# Altium footprint library Connector_PinHeader_1.27mm.PcbLib: 278 footprints (part 15 of 18) (continued)
## PinHeader_2x24_P1.27mm_Vertical_SMD [mm] (continued)
  text "'.Designator'" at 0.84,-4.047 h1

## PinHeader_2x25_P1.27mm_Horizontal [mm]
pads (50):
  rect 1x1 hole 0.65: 1(0,0)
  rrect100% 1x1 hole 0.65: 2(1.27,0) 3(0,-1.27) 4(1.27,-1.27) 5(0,-2.54) 6(1.27,-2.54) 7(0,-3.81) 8(1.27,-3.81) 9(0,-5.08) 10(1.27,-5.08) 11(0,-6.35) 12(1.27,-6.35) 13(0,-7.62) 14(1.27,-7.62) 15(0,-8.89) 16(1.27,-8.89) 17(0,-10.16) 18(1.27,-10.16) 19(0,-11.43) 20(1.27,-11.43) 21(0,-12.7) 22(1.27,-12.7) 23(0,-13.97) 24(1.27,-13.97) 25(0,-15.24) 26(1.27,-15.24) 27(0,-16.51) 28(1.27,-16.51) 29(0,-17.78) 30(1.27,-17.78) 31(0,-19.05) 32(1.27,-19.05) 33(0,-20.32) 34(1.27,-20.32) 35(0,-21.59) 36(1.27,-21.59) 37(0,-22.86) 38(1.27,-22.86) 39(0,-24.13) 40(1.27,-24.13) 41(0,-25.4) 42(1.27,-25.4) 43(0,-26.67) 44(1.27,-26.67) 45(0,-27.94) 46(1.27,-27.94) 47(0,-29.21) 48(1.27,-29.21) 49(0,-30.48) 50(1.27,-30.48)
F.SilkS:
  lines w0.12: -0.76,0 -0.76,0.76 0,0.76 ; 1.71,-31.1 1.71,-31.175 2.83,-31.175 2.83,0.695 1.71,0.695 1.71,0.62 ; 1.71,-29.86 1.71,-29.83 ; 1.71,-29.845 2.83,-29.845 ; 1.71,-28.59 1.71,-28.56 ; 1.71,-28.575 2.83,-28.575 ; 1.71,-27.32 1.71,-27.29 ; 1.71,-27.305 2.83,-27.305 ; 1.71,-26.05 1.71,-26.02 ; 1.71,-26.035 2.83,-26.035 ; 1.71,-24.78 1.71,-24.75 ; 1.71,-24.765 2.83,-24.765 ; 1.71,-23.51 1.71,-23.48 ; 1.71,-23.495 2.83,-23.495 ; 1.71,-22.24 1.71,-22.21 ; 1.71,-22.225 2.83,-22.225 ; 1.71,-20.97 1.71,-20.94 ; 1.71,-20.955 2.83,-20.955 ; 1.71,-19.7 1.71,-19.67 ; 1.71,-19.685 2.83,-19.685 ; 1.71,-18.43 1.71,-18.4 ; 1.71,-18.415 2.83,-18.415 ; 1.71,-17.16 1.71,-17.13 ; 1.71,-17.145 2.83,-17.145 ; 1.71,-15.89 1.71,-15.86 ; 1.71,-15.875 2.83,-15.875 ; 1.71,-14.62 1.71,-14.59 ; 1.71,-14.605 2.83,-14.605 ; 1.71,-13.35 1.71,-13.32 ; 1.71,-13.335 2.83,-13.335 ; 1.71,-12.08 1.71,-12.05 ; 1.71,-12.065 2.83,-12.065 ; 1.71,-10.81 1.71,-10.78 ; 1.71,-10.795 2.83,-10.795 ; 1.71,-9.54 1.71,-9.51 ; 1.71,-9.525 2.83,-9.525 ; 1.71,-8.27 1.71,-8.24 ; 1.71,-8.255 2.83,-8.255 ; 1.71,-7 1.71,-6.97 ; 1.71,-6.985 2.83,-6.985 ; 1.71,-5.73 1.71,-5.7 ; 1.71,-5.715 2.83,-5.715 ; 1.71,-4.46 1.71,-4.43 ; 1.71,-4.445 2.83,-4.445 ; 1.71,-3.19 1.71,-3.16 ; 1.71,-3.175 2.83,-3.175 ; 1.71,-1.92 1.71,-1.89 ; 1.71,-1.905 2.83,-1.905 ; 1.71,-0.65 1.71,-0.62 ; 1.71,-0.635 2.83,-0.635 ; 2.83,-30.74 6.83,-30.74 6.83,-30.22 2.83,-30.22 ; 2.83,-29.47 6.83,-29.47 6.83,-28.95 2.83,-28.95 ; 2.83,-28.2 6.83,-28.2 6.83,-27.68 2.83,-27.68 ; 2.83,-26.93 6.83,-26.93 6.83,-26.41 2.83,-26.41 ; 2.83,-25.66 6.83,-25.66 6.83,-25.14 2.83,-25.14 ; 2.83,-24.39 6.83,-24.39 6.83,-23.87 2.83,-23.87 ; 2.83,-23.12 6.83,-23.12 6.83,-22.6 2.83,-22.6 ; 2.83,-21.85 6.83,-21.85 6.83,-21.33 2.83,-21.33 ; 2.83,-20.58 6.83,-20.58 6.83,-20.06 2.83,-20.06 ; 2.83,-19.31 6.83,-19.31 6.83,-18.79 2.83,-18.79 ; 2.83,-18.04 6.83,-18.04 6.83,-17.52 2.83,-17.52 ; 2.83,-16.77 6.83,-16.77 6.83,-16.25 2.83,-16.25 ; 2.83,-15.5 6.83,-15.5 6.83,-14.98 2.83,-14.98 ; 2.83,-14.23 6.83,-14.23 6.83,-13.71 2.83,-13.71 ; 2.83,-12.96 6.83,-12.96 6.83,-12.44 2.83,-12.44 ; 2.83,-11.69 6.83,-11.69 6.83,-11.17 2.83,-11.17 ; 2.83,-10.42 6.83,-10.42 6.83,-9.9 2.83,-9.9 ; 2.83,-9.15 6.83,-9.15 6.83,-8.63 2.83,-8.63 ; 2.83,-7.88 6.83,-7.88 6.83,-7.36 2.83,-7.36 ; 2.83,-6.61 6.83,-6.61 6.83,-6.09 2.83,-6.09 ; 2.83,-5.34 6.83,-5.34 6.83,-4.82 2.83,-4.82 ; 2.83,-4.07 6.83,-4.07 6.83,-3.55 2.83,-3.55 ; 2.83,-2.8 6.83,-2.8 6.83,-2.28 2.83,-2.28 ; 2.83,-1.53 6.83,-1.53 6.83,-1.01 2.83,-1.01 ; 2.83,-0.26 6.83,-0.26 6.83,0.26 2.83,0.26 ; 2.83,-0.16 6.83,-0.16 ; 2.83,-0.04 6.83,-0.04 ; 2.83,0.08 6.83,0.08 ; 2.83,0.2 6.83,0.2
F.CrtYd:
  lines w0.05: -1.15,-31.65 -1.15,1.15 7.3,1.15 7.3,-31.65 -1.15,-31.65
F.Fab:
  drawing of 155 lines, arcs and shapes, not listed
  text "'.Designator'" at 2.774,-17.668 h0.6

## PinHeader_2x25_P1.27mm_Vertical [mm]
pads (50):
  rect 1x1 hole 0.65: 1(0,0)
  rrect100% 1x1 hole 0.65: 2(1.27,0) 3(0,-1.27) 4(1.27,-1.27) 5(0,-2.54) 6(1.27,-2.54) 7(0,-3.81) 8(1.27,-3.81) 9(0,-5.08) 10(1.27,-5.08) 11(0,-6.35) 12(1.27,-6.35) 13(0,-7.62) 14(1.27,-7.62) 15(0,-8.89) 16(1.27,-8.89) 17(0,-10.16) 18(1.27,-10.16) 19(0,-11.43) 20(1.27,-11.43) 21(0,-12.7) 22(1.27,-12.7) 23(0,-13.97) 24(1.27,-13.97) 25(0,-15.24) 26(1.27,-15.24) 27(0,-16.51) 28(1.27,-16.51) 29(0,-17.78) 30(1.27,-17.78) 31(0,-19.05) 32(1.27,-19.05) 33(0,-20.32) 34(1.27,-20.32) 35(0,-21.59) 36(1.27,-21.59) 37(0,-22.86) 38(1.27,-22.86) 39(0,-24.13) 40(1.27,-24.13) 41(0,-25.4) 42(1.27,-25.4) 43(0,-26.67) 44(1.27,-26.67) 45(0,-27.94) 46(1.27,-27.94) 47(0,-29.21) 48(1.27,-29.21) 49(0,-30.48) 50(1.27,-30.48)
F.SilkS:
  lines w0.12: -1.13,0 -1.13,0.76 0,0.76 ; -0.563,-0.76 -1.13,-0.76 -1.13,-31.175 -0.308,-31.175 ; 0.308,-31.175 0.962,-31.175 ; 0.563,-0.76 0.707,-0.76 ; 0.76,-0.707 0.76,-0.563 ; 0.76,0.563 0.76,0.695 0.962,0.695 ; 1.578,-31.175 2.4,-31.175 2.4,0.695 1.578,0.695
F.CrtYd:
  lines w0.05: -1.6,-31.65 -1.6,1.15 2.85,1.15 2.85,-31.65 -1.6,-31.65
F.Fab:
  lines w0.1: -1.07,-31.115 2.34,-31.115 2.34,0.635 -0.218,0.635 -1.07,-0.218 -1.07,-31.115
  text "'.Designator'" at 1.475,-19.287 h1

## PinHeader_2x25_P1.27mm_Vertical_SMD [mm]
pads (50):
  rect 2.4x0.74 smd: 1(-1.95,15.24) 2(1.95,15.24) 3(-1.95,13.97) 4(1.95,13.97) 5(-1.95,12.7) 6(1.95,12.7) 7(-1.95,11.43) 8(1.95,11.43) 9(-1.95,10.16) 10(1.95,10.16) 11(-1.95,8.89) 12(1.95,8.89) 13(-1.95,7.62) 14(1.95,7.62) 15(-1.95,6.35) 16(1.95,6.35) 17(-1.95,5.08) 18(1.95,5.08) 19(-1.95,3.81) 20(1.95,3.81) 21(-1.95,2.54) 22(1.95,2.54) 23(-1.95,1.27) 24(1.95,1.27) 25(-1.95,0) 26(1.95,0) 27(-1.95,-1.27) 28(1.95,-1.27) 29(-1.95,-2.54) 30(1.95,-2.54) 31(-1.95,-3.81) 32(1.95,-3.81) 33(-1.95,-5.08) 34(1.95,-5.08) 35(-1.95,-6.35) 36(1.95,-6.35) 37(-1.95,-7.62) 38(1.95,-7.62) 39(-1.95,-8.89) 40(1.95,-8.89) 41(-1.95,-10.16) 42(1.95,-10.16) 43(-1.95,-11.43) 44(1.95,-11.43) 45(-1.95,-12.7) 46(1.95,-12.7) 47(-1.95,-13.97) 48(1.95,-13.97) 49(-1.95,-15.24) 50(1.95,-15.24)
F.SilkS:
  lines w0.12: -3.09,15.87 -1.765,15.87 -1.765,15.935 1.765,15.935 1.765,15.87 ; -1.765,-15.87 -1.765,-15.935 1.765,-15.935 1.765,-15.87
F.CrtYd:
  lines w0.05: -4.3,-16.4 4.3,-16.4 4.3,16.4 -4.3,16.4 -4.3,-16.4
F.Fab:
  drawing of 155 lines, arcs and shapes, not listed
  text "'.Designator'" at 0.84,-4.047 h1

## PinHeader_2x26_P1.27mm_Horizontal [mm]
pads (52):
  rect 1x1 hole 0.65: 1(0,0)
  rrect100% 1x1 hole 0.65: 2(1.27,0) 3(0,-1.27) 4(1.27,-1.27) 5(0,-2.54) 6(1.27,-2.54) 7(0,-3.81) 8(1.27,-3.81) 9(0,-5.08) 10(1.27,-5.08) 11(0,-6.35) 12(1.27,-6.35) 13(0,-7.62) 14(1.27,-7.62) 15(0,-8.89) 16(1.27,-8.89) 17(0,-10.16) 18(1.27,-10.16) 19(0,-11.43) 20(1.27,-11.43) 21(0,-12.7) 22(1.27,-12.7) 23(0,-13.97) 24(1.27,-13.97) 25(0,-15.24) 26(1.27,-15.24) 27(0,-16.51) 28(1.27,-16.51) 29(0,-17.78) 30(1.27,-17.78) 31(0,-19.05) 32(1.27,-19.05) 33(0,-20.32) 34(1.27,-20.32) 35(0,-21.59) 36(1.27,-21.59) 37(0,-22.86) 38(1.27,-22.86) 39(0,-24.13) 40(1.27,-24.13) 41(0,-25.4) 42(1.27,-25.4) 43(0,-26.67) 44(1.27,-26.67) 45(0,-27.94) 46(1.27,-27.94) 47(0,-29.21) 48(1.27,-29.21) 49(0,-30.48) 50(1.27,-30.48) 51(0,-31.75) 52(1.27,-31.75)
F.SilkS:
  lines w0.12: -0.76,0 -0.76,0.76 0,0.76 ; 1.71,-32.37 1.71,-32.445 2.83,-32.445 2.83,0.695 1.71,0.695 1.71,0.62 ; 1.71,-31.13 1.71,-31.1 ; 1.71,-31.115 2.83,-31.115 ; 1.71,-29.86 1.71,-29.83 ; 1.71,-29.845 2.83,-29.845 ; 1.71,-28.59 1.71,-28.56 ; 1.71,-28.575 2.83,-28.575 ; 1.71,-27.32 1.71,-27.29 ; 1.71,-27.305 2.83,-27.305 ; 1.71,-26.05 1.71,-26.02 ; 1.71,-26.035 2.83,-26.035 ; 1.71,-24.78 1.71,-24.75 ; 1.71,-24.765 2.83,-24.765 ; 1.71,-23.51 1.71,-23.48 ; 1.71,-23.495 2.83,-23.495 ; 1.71,-22.24 1.71,-22.21 ; 1.71,-22.225 2.83,-22.225 ; 1.71,-20.97 1.71,-20.94 ; 1.71,-20.955 2.83,-20.955 ; 1.71,-19.7 1.71,-19.67 ; 1.71,-19.685 2.83,-19.685 ; 1.71,-18.43 1.71,-18.4 ; 1.71,-18.415 2.83,-18.415 ; 1.71,-17.16 1.71,-17.13 ; 1.71,-17.145 2.83,-17.145 ; 1.71,-15.89 1.71,-15.86 ; 1.71,-15.875 2.83,-15.875 ; 1.71,-14.62 1.71,-14.59 ; 1.71,-14.605 2.83,-14.605 ; 1.71,-13.35 1.71,-13.32 ; 1.71,-13.335 2.83,-13.335 ; 1.71,-12.08 1.71,-12.05 ; 1.71,-12.065 2.83,-12.065 ; 1.71,-10.81 1.71,-10.78 ; 1.71,-10.795 2.83,-10.795 ; 1.71,-9.54 1.71,-9.51 ; 1.71,-9.525 2.83,-9.525 ; 1.71,-8.27 1.71,-8.24 ; 1.71,-8.255 2.83,-8.255 ; 1.71,-7 1.71,-6.97 ; 1.71,-6.985 2.83,-6.985 ; 1.71,-5.73 1.71,-5.7 ; 1.71,-5.715 2.83,-5.715 ; 1.71,-4.46 1.71,-4.43 ; 1.71,-4.445 2.83,-4.445 ; 1.71,-3.19 1.71,-3.16 ; 1.71,-3.175 2.83,-3.175 ; 1.71,-1.92 1.71,-1.89 ; 1.71,-1.905 2.83,-1.905 ; 1.71,-0.65 1.71,-0.62 ; 1.71,-0.635 2.83,-0.635 ; 2.83,-32.01 6.83,-32.01 6.83,-31.49 2.83,-31.49 ; 2.83,-30.74 6.83,-30.74 6.83,-30.22 2.83,-30.22 ; 2.83,-29.47 6.83,-29.47 6.83,-28.95 2.83,-28.95 ; 2.83,-28.2 6.83,-28.2 6.83,-27.68 2.83,-27.68 ; 2.83,-26.93 6.83,-26.93 6.83,-26.41 2.83,-26.41 ; 2.83,-25.66 6.83,-25.66 6.83,-25.14 2.83,-25.14 ; 2.83,-24.39 6.83,-24.39 6.83,-23.87 2.83,-23.87 ; 2.83,-23.12 6.83,-23.12 6.83,-22.6 2.83,-22.6 ; 2.83,-21.85 6.83,-21.85 6.83,-21.33 2.83,-21.33 ; 2.83,-20.58 6.83,-20.58 6.83,-20.06 2.83,-20.06 ; 2.83,-19.31 6.83,-19.31 6.83,-18.79 2.83,-18.79 ; 2.83,-18.04 6.83,-18.04 6.83,-17.52 2.83,-17.52 ; 2.83,-16.77 6.83,-16.77 6.83,-16.25 2.83,-16.25 ; 2.83,-15.5 6.83,-15.5 6.83,-14.98 2.83,-14.98 ; 2.83,-14.23 6.83,-14.23 6.83,-13.71 2.83,-13.71 ; 2.83,-12.96 6.83,-12.96 6.83,-12.44 2.83,-12.44 ; 2.83,-11.69 6.83,-11.69 6.83,-11.17 2.83,-11.17 ; 2.83,-10.42 6.83,-10.42 6.83,-9.9 2.83,-9.9 ; 2.83,-9.15 6.83,-9.15 6.83,-8.63 2.83,-8.63 ; 2.83,-7.88 6.83,-7.88 6.83,-7.36 2.83,-7.36 ; 2.83,-6.61 6.83,-6.61 6.83,-6.09 2.83,-6.09 ; 2.83,-5.34 6.83,-5.34 6.83,-4.82 2.83,-4.82 ; 2.83,-4.07 6.83,-4.07 6.83,-3.55 2.83,-3.55 ; 2.83,-2.8 6.83,-2.8 6.83,-2.28 2.83,-2.28 ; 2.83,-1.53 6.83,-1.53 6.83,-1.01 2.83,-1.01 ; 2.83,-0.26 6.83,-0.26 6.83,0.26 2.83,0.26 ; 2.83,-0.16 6.83,-0.16 ; 2.83,-0.04 6.83,-0.04 ; 2.83,0.08 6.83,0.08 ; 2.83,0.2 6.83,0.2
F.CrtYd:
  lines w0.05: -1.15,-32.9 -1.15,1.15 7.3,1.15 7.3,-32.9 -1.15,-32.9
F.Fab:
  drawing of 161 lines, arcs and shapes, not listed
  text "'.Designator'" at 2.774,-18.303 h0.6

## PinHeader_2x26_P1.27mm_Vertical [mm]
pads (52):
  rect 1x1 hole 0.65: 1(0,0)
  rrect100% 1x1 hole 0.65: 2(1.27,0) 3(0,-1.27) 4(1.27,-1.27) 5(0,-2.54) 6(1.27,-2.54) 7(0,-3.81) 8(1.27,-3.81) 9(0,-5.08) 10(1.27,-5.08) 11(0,-6.35) 12(1.27,-6.35) 13(0,-7.62) 14(1.27,-7.62) 15(0,-8.89) 16(1.27,-8.89) 17(0,-10.16) 18(1.27,-10.16) 19(0,-11.43) 20(1.27,-11.43) 21(0,-12.7) 22(1.27,-12.7) 23(0,-13.97) 24(1.27,-13.97) 25(0,-15.24) 26(1.27,-15.24) 27(0,-16.51) 28(1.27,-16.51) 29(0,-17.78) 30(1.27,-17.78) 31(0,-19.05) 32(1.27,-19.05) 33(0,-20.32) 34(1.27,-20.32) 35(0,-21.59) 36(1.27,-21.59) 37(0,-22.86) 38(1.27,-22.86) 39(0,-24.13) 40(1.27,-24.13) 41(0,-25.4) 42(1.27,-25.4) 43(0,-26.67) 44(1.27,-26.67) 45(0,-27.94) 46(1.27,-27.94) 47(0,-29.21) 48(1.27,-29.21) 49(0,-30.48) 50(1.27,-30.48) 51(0,-31.75) 52(1.27,-31.75)
F.SilkS:
  lines w0.12: -1.13,0 -1.13,0.76 0,0.76 ; -0.563,-0.76 -1.13,-0.76 -1.13,-32.445 -0.308,-32.445 ; 0.308,-32.445 0.962,-32.445 ; 0.563,-0.76 0.707,-0.76 ; 0.76,-0.707 0.76,-0.563 ; 0.76,0.563 0.76,0.695 0.962,0.695 ; 1.578,-32.445 2.4,-32.445 2.4,0.695 1.578,0.695
F.CrtYd:
  lines w0.05: -1.6,-32.9 -1.6,1.15 2.85,1.15 2.85,-32.9 -1.6,-32.9
F.Fab:
  lines w0.1: -1.07,-32.385 2.34,-32.385 2.34,0.635 -0.218,0.635 -1.07,-0.218 -1.07,-32.385
  text "'.Designator'" at 1.475,-19.922 h1

## PinHeader_2x26_P1.27mm_Vertical_SMD [mm]
pads (52):
  rect 2.4x0.74 smd: 1(-1.95,15.875) 2(1.95,15.875) 3(-1.95,14.605) 4(1.95,14.605) 5(-1.95,13.335) 6(1.95,13.335) 7(-1.95,12.065) 8(1.95,12.065) 9(-1.95,10.795) 10(1.95,10.795) 11(-1.95,9.525) 12(1.95,9.525) 13(-1.95,8.255) 14(1.95,8.255) 15(-1.95,6.985) 16(1.95,6.985) 17(-1.95,5.715) 18(1.95,5.715) 19(-1.95,4.445) 20(1.95,4.445) 21(-1.95,3.175) 22(1.95,3.175) 23(-1.95,1.905) 24(1.95,1.905) 25(-1.95,0.635) 26(1.95,0.635) 27(-1.95,-0.635) 28(1.95,-0.635) 29(-1.95,-1.905) 30(1.95,-1.905) 31(-1.95,-3.175) 32(1.95,-3.175) 33(-1.95,-4.445) 34(1.95,-4.445) 35(-1.95,-5.715) 36(1.95,-5.715) 37(-1.95,-6.985) 38(1.95,-6.985) 39(-1.95,-8.255) 40(1.95,-8.255) 41(-1.95,-9.525) 42(1.95,-9.525) 43(-1.95,-10.795) 44(1.95,-10.795) 45(-1.95,-12.065) 46(1.95,-12.065) 47(-1.95,-13.335) 48(1.95,-13.335) 49(-1.95,-14.605) 50(1.95,-14.605) 51(-1.95,-15.875) 52(1.95,-15.875)
F.SilkS:
  lines w0.12: -3.09,16.505 -1.765,16.505 -1.765,16.57 1.765,16.57 1.765,16.505 ; -1.765,-16.505 -1.765,-16.57 1.765,-16.57 1.765,-16.505
F.CrtYd:
  lines w0.05: -4.3,-17.05 -4.3,17.05 4.3,17.05 4.3,-17.05 -4.3,-17.05
F.Fab:
  drawing of 161 lines, arcs and shapes, not listed
  text "'.Designator'" at 0.84,-4.047 h1

## PinHeader_2x27_P1.27mm_Horizontal [mm]
pads (54):
  rect 1x1 hole 0.65: 1(0,0)
  rrect100% 1x1 hole 0.65: 2(1.27,0) 3(0,-1.27) 4(1.27,-1.27) 5(0,-2.54) 6(1.27,-2.54) 7(0,-3.81) 8(1.27,-3.81) 9(0,-5.08) 10(1.27,-5.08) 11(0,-6.35) 12(1.27,-6.35) 13(0,-7.62) 14(1.27,-7.62) 15(0,-8.89) 16(1.27,-8.89) 17(0,-10.16) 18(1.27,-10.16) 19(0,-11.43) 20(1.27,-11.43) 21(0,-12.7) 22(1.27,-12.7) 23(0,-13.97) 24(1.27,-13.97) 25(0,-15.24) 26(1.27,-15.24) 27(0,-16.51) 28(1.27,-16.51) 29(0,-17.78) 30(1.27,-17.78) 31(0,-19.05) 32(1.27,-19.05) 33(0,-20.32) 34(1.27,-20.32) 35(0,-21.59) 36(1.27,-21.59) 37(0,-22.86) 38(1.27,-22.86) 39(0,-24.13) 40(1.27,-24.13) 41(0,-25.4) 42(1.27,-25.4) 43(0,-26.67) 44(1.27,-26.67) 45(0,-27.94) 46(1.27,-27.94) 47(0,-29.21) 48(1.27,-29.21) 49(0,-30.48) 50(1.27,-30.48) 51(0,-31.75) 52(1.27,-31.75) 53(0,-33.02) 54(1.27,-33.02)
F.SilkS:
  lines w0.12: -0.76,0 -0.76,0.76 0,0.76 ; 1.71,-33.64 1.71,-33.715 2.83,-33.715 2.83,0.695 1.71,0.695 1.71,0.62 ; 1.71,-32.4 1.71,-32.37 ; 1.71,-32.385 2.83,-32.385 ; 1.71,-31.13 1.71,-31.1 ; 1.71,-31.115 2.83,-31.115 ; 1.71,-29.86 1.71,-29.83 ; 1.71,-29.845 2.83,-29.845 ; 1.71,-28.59 1.71,-28.56 ; 1.71,-28.575 2.83,-28.575 ; 1.71,-27.32 1.71,-27.29 ; 1.71,-27.305 2.83,-27.305 ; 1.71,-26.05 1.71,-26.02 ; 1.71,-26.035 2.83,-26.035 ; 1.71,-24.78 1.71,-24.75 ; 1.71,-24.765 2.83,-24.765 ; 1.71,-23.51 1.71,-23.48 ; 1.71,-23.495 2.83,-23.495 ; 1.71,-22.24 1.71,-22.21 ; 1.71,-22.225 2.83,-22.225 ; 1.71,-20.97 1.71,-20.94 ; 1.71,-20.955 2.83,-20.955 ; 1.71,-19.7 1.71,-19.67 ; 1.71,-19.685 2.83,-19.685 ; 1.71,-18.43 1.71,-18.4 ; 1.71,-18.415 2.83,-18.415 ; 1.71,-17.16 1.71,-17.13 ; 1.71,-17.145 2.83,-17.145 ; 1.71,-15.89 1.71,-15.86 ; 1.71,-15.875 2.83,-15.875 ; 1.71,-14.62 1.71,-14.59 ; 1.71,-14.605 2.83,-14.605 ; 1.71,-13.35 1.71,-13.32 ; 1.71,-13.335 2.83,-13.335 ; 1.71,-12.08 1.71,-12.05 ; 1.71,-12.065 2.83,-12.065 ; 1.71,-10.81 1.71,-10.78 ; 1.71,-10.795 2.83,-10.795 ; 1.71,-9.54 1.71,-9.51 ; 1.71,-9.525 2.83,-9.525 ; 1.71,-8.27 1.71,-8.24 ; 1.71,-8.255 2.83,-8.255 ; 1.71,-7 1.71,-6.97 ; 1.71,-6.985 2.83,-6.985 ; 1.71,-5.73 1.71,-5.7 ; 1.71,-5.715 2.83,-5.715 ; 1.71,-4.46 1.71,-4.43 ; 1.71,-4.445 2.83,-4.445 ; 1.71,-3.19 1.71,-3.16 ; 1.71,-3.175 2.83,-3.175 ; 1.71,-1.92 1.71,-1.89 ; 1.71,-1.905 2.83,-1.905 ; 1.71,-0.65 1.71,-0.62 ; 1.71,-0.635 2.83,-0.635 ; 2.83,-33.28 6.83,-33.28 6.83,-32.76 2.83,-32.76 ; 2.83,-32.01 6.83,-32.01 6.83,-31.49 2.83,-31.49 ; 2.83,-30.74 6.83,-30.74 6.83,-30.22 2.83,-30.22 ; 2.83,-29.47 6.83,-29.47 6.83,-28.95 2.83,-28.95 ; 2.83,-28.2 6.83,-28.2 6.83,-27.68 2.83,-27.68 ; 2.83,-26.93 6.83,-26.93 6.83,-26.41 2.83,-26.41 ; 2.83,-25.66 6.83,-25.66 6.83,-25.14 2.83,-25.14 ; 2.83,-24.39 6.83,-24.39 6.83,-23.87 2.83,-23.87 ; 2.83,-23.12 6.83,-23.12 6.83,-22.6 2.83,-22.6 ; 2.83,-21.85 6.83,-21.85 6.83,-21.33 2.83,-21.33 ; 2.83,-20.58 6.83,-20.58 6.83,-20.06 2.83,-20.06 ; 2.83,-19.31 6.83,-19.31 6.83,-18.79 2.83,-18.79 ; 2.83,-18.04 6.83,-18.04 6.83,-17.52 2.83,-17.52 ; 2.83,-16.77 6.83,-16.77 6.83,-16.25 2.83,-16.25 ; 2.83,-15.5 6.83,-15.5 6.83,-14.98 2.83,-14.98 ; 2.83,-14.23 6.83,-14.23 6.83,-13.71 2.83,-13.71 ; 2.83,-12.96 6.83,-12.96 6.83,-12.44 2.83,-12.44 ; 2.83,-11.69 6.83,-11.69 6.83,-11.17 2.83,-11.17 ; 2.83,-10.42 6.83,-10.42 6.83,-9.9 2.83,-9.9 ; 2.83,-9.15 6.83,-9.15 6.83,-8.63 2.83,-8.63 ; 2.83,-7.88 6.83,-7.88 6.83,-7.36 2.83,-7.36 ; 2.83,-6.61 6.83,-6.61 6.83,-6.09 2.83,-6.09 ; 2.83,-5.34 6.83,-5.34 6.83,-4.82 2.83,-4.82 ; 2.83,-4.07 6.83,-4.07 6.83,-3.55 2.83,-3.55 ; 2.83,-2.8 6.83,-2.8 6.83,-2.28 2.83,-2.28 ; 2.83,-1.53 6.83,-1.53 6.83,-1.01 2.83,-1.01 ; 2.83,-0.26 6.83,-0.26 6.83,0.26 2.83,0.26 ; 2.83,-0.16 6.83,-0.16 ; 2.83,-0.04 6.83,-0.04 ; 2.83,0.08 6.83,0.08 ; 2.83,0.2 6.83,0.2
F.CrtYd:
  lines w0.05: -1.15,-34.2 7.3,-34.2 7.3,1.15 -1.15,1.15 -1.15,-34.2
F.Fab:
  drawing of 167 lines, arcs and shapes, not listed
  text "'.Designator'" at 2.774,-18.938 h0.6

## PinHeader_2x27_P1.27mm_Vertical [mm]
pads (54):
  rect 1x1 hole 0.65: 1(0,0)
  rrect100% 1x1 hole 0.65: 2(1.27,0) 3(0,-1.27) 4(1.27,-1.27) 5(0,-2.54) 6(1.27,-2.54) 7(0,-3.81) 8(1.27,-3.81) 9(0,-5.08) 10(1.27,-5.08) 11(0,-6.35) 12(1.27,-6.35) 13(0,-7.62) 14(1.27,-7.62) 15(0,-8.89) 16(1.27,-8.89) 17(0,-10.16) 18(1.27,-10.16) 19(0,-11.43) 20(1.27,-11.43) 21(0,-12.7) 22(1.27,-12.7) 23(0,-13.97) 24(1.27,-13.97) 25(0,-15.24) 26(1.27,-15.24) 27(0,-16.51) 28(1.27,-16.51) 29(0,-17.78) 30(1.27,-17.78) 31(0,-19.05) 32(1.27,-19.05) 33(0,-20.32) 34(1.27,-20.32) 35(0,-21.59) 36(1.27,-21.59) 37(0,-22.86) 38(1.27,-22.86) 39(0,-24.13) 40(1.27,-24.13) 41(0,-25.4) 42(1.27,-25.4) 43(0,-26.67) 44(1.27,-26.67) 45(0,-27.94) 46(1.27,-27.94) 47(0,-29.21) 48(1.27,-29.21) 49(0,-30.48) 50(1.27,-30.48) 51(0,-31.75) 52(1.27,-31.75) 53(0,-33.02) 54(1.27,-33.02)
F.SilkS:
  lines w0.12: -1.13,0 -1.13,0.76 0,0.76 ; -0.563,-0.76 -1.13,-0.76 -1.13,-33.715 -0.308,-33.715 ; 0.308,-33.715 0.962,-33.715 ; 0.563,-0.76 0.707,-0.76 ; 0.76,-0.707 0.76,-0.563 ; 0.76,0.563 0.76,0.695 0.962,0.695 ; 1.578,-33.715 2.4,-33.715 2.4,0.695 1.578,0.695
F.CrtYd:
  lines w0.05: -1.6,-34.2 -1.6,1.15 2.85,1.15 2.85,-34.2 -1.6,-34.2
F.Fab:
  lines w0.1: -1.07,-33.655 2.34,-33.655 2.34,0.635 -0.218,0.635 -1.07,-0.218 -1.07,-33.655
  text "'.Designator'" at 1.475,-20.557 h1

## PinHeader_2x27_P1.27mm_Vertical_SMD [mm]
pads (54):
  rect 2.4x0.74 smd: 1(-1.95,16.51) 2(1.95,16.51) 3(-1.95,15.24) 4(1.95,15.24) 5(-1.95,13.97) 6(1.95,13.97) 7(-1.95,12.7) 8(1.95,12.7) 9(-1.95,11.43) 10(1.95,11.43) 11(-1.95,10.16) 12(1.95,10.16) 13(-1.95,8.89) 14(1.95,8.89) 15(-1.95,7.62) 16(1.95,7.62) 17(-1.95,6.35) 18(1.95,6.35) 19(-1.95,5.08) 20(1.95,5.08) 21(-1.95,3.81) 22(1.95,3.81) 23(-1.95,2.54) 24(1.95,2.54) 25(-1.95,1.27) 26(1.95,1.27) 27(-1.95,0) 28(1.95,0) 29(-1.95,-1.27) 30(1.95,-1.27) 31(-1.95,-2.54) 32(1.95,-2.54) 33(-1.95,-3.81) 34(1.95,-3.81) 35(-1.95,-5.08) 36(1.95,-5.08) 37(-1.95,-6.35) 38(1.95,-6.35) 39(-1.95,-7.62) 40(1.95,-7.62) 41(-1.95,-8.89) 42(1.95,-8.89) 43(-1.95,-10.16) 44(1.95,-10.16) 45(-1.95,-11.43) 46(1.95,-11.43) 47(-1.95,-12.7) 48(1.95,-12.7) 49(-1.95,-13.97) 50(1.95,-13.97) 51(-1.95,-15.24) 52(1.95,-15.24) 53(-1.95,-16.51) 54(1.95,-16.51)
F.SilkS:
  lines w0.12: -3.09,17.14 -1.765,17.14 -1.765,17.205 1.765,17.205 1.765,17.14 ; -1.765,-17.14 -1.765,-17.205 1.765,-17.205 1.765,-17.14
F.CrtYd:
  lines w0.05: -4.3,-17.65 -4.3,17.65 4.3,17.65 4.3,-17.65 -4.3,-17.65
F.Fab:
  drawing of 167 lines, arcs and shapes, not listed
  text "'.Designator'" at 0.84,-4.047 h1

## PinHeader_2x28_P1.27mm_Horizontal [mm]
pads (56):
  rect 1x1 hole 0.65: 1(0,0)
  rrect100% 1x1 hole 0.65: 2(1.27,0) 3(0,-1.27) 4(1.27,-1.27) 5(0,-2.54) 6(1.27,-2.54) 7(0,-3.81) 8(1.27,-3.81) 9(0,-5.08) 10(1.27,-5.08) 11(0,-6.35) 12(1.27,-6.35) 13(0,-7.62) 14(1.27,-7.62) 15(0,-8.89) 16(1.27,-8.89) 17(0,-10.16) 18(1.27,-10.16) 19(0,-11.43) 20(1.27,-11.43) 21(0,-12.7) 22(1.27,-12.7) 23(0,-13.97) 24(1.27,-13.97) 25(0,-15.24) 26(1.27,-15.24) 27(0,-16.51) 28(1.27,-16.51) 29(0,-17.78) 30(1.27,-17.78) 31(0,-19.05) 32(1.27,-19.05) 33(0,-20.32) 34(1.27,-20.32) 35(0,-21.59) 36(1.27,-21.59) 37(0,-22.86) 38(1.27,-22.86) 39(0,-24.13) 40(1.27,-24.13) 41(0,-25.4) 42(1.27,-25.4) 43(0,-26.67) 44(1.27,-26.67) 45(0,-27.94) 46(1.27,-27.94) 47(0,-29.21) 48(1.27,-29.21) 49(0,-30.48) 50(1.27,-30.48) 51(0,-31.75) 52(1.27,-31.75) 53(0,-33.02) 54(1.27,-33.02) 55(0,-34.29) 56(1.27,-34.29)
F.SilkS:
  lines w0.12: -0.76,0 -0.76,0.76 0,0.76 ; 1.71,-34.91 1.71,-34.985 2.83,-34.985 2.83,0.695 1.71,0.695 1.71,0.62 ; 1.71,-33.67 1.71,-33.64 ; 1.71,-33.655 2.83,-33.655 ; 1.71,-32.4 1.71,-32.37 ; 1.71,-32.385 2.83,-32.385 ; 1.71,-31.13 1.71,-31.1 ; 1.71,-31.115 2.83,-31.115 ; 1.71,-29.86 1.71,-29.83 ; 1.71,-29.845 2.83,-29.845 ; 1.71,-28.59 1.71,-28.56 ; 1.71,-28.575 2.83,-28.575 ; 1.71,-27.32 1.71,-27.29 ; 1.71,-27.305 2.83,-27.305 ; 1.71,-26.05 1.71,-26.02 ; 1.71,-26.035 2.83,-26.035 ; 1.71,-24.78 1.71,-24.75 ; 1.71,-24.765 2.83,-24.765 ; 1.71,-23.51 1.71,-23.48 ; 1.71,-23.495 2.83,-23.495 ; 1.71,-22.24 1.71,-22.21 ; 1.71,-22.225 2.83,-22.225 ; 1.71,-20.97 1.71,-20.94 ; 1.71,-20.955 2.83,-20.955 ; 1.71,-19.7 1.71,-19.67 ; 1.71,-19.685 2.83,-19.685 ; 1.71,-18.43 1.71,-18.4 ; 1.71,-18.415 2.83,-18.415 ; 1.71,-17.16 1.71,-17.13 ; 1.71,-17.145 2.83,-17.145 ; 1.71,-15.89 1.71,-15.86 ; 1.71,-15.875 2.83,-15.875 ; 1.71,-14.62 1.71,-14.59 ; 1.71,-14.605 2.83,-14.605 ; 1.71,-13.35 1.71,-13.32 ; 1.71,-13.335 2.83,-13.335 ; 1.71,-12.08 1.71,-12.05 ; 1.71,-12.065 2.83,-12.065 ; 1.71,-10.81 1.71,-10.78 ; 1.71,-10.795 2.83,-10.795 ; 1.71,-9.54 1.71,-9.51 ; 1.71,-9.525 2.83,-9.525 ; 1.71,-8.27 1.71,-8.24 ; 1.71,-8.255 2.83,-8.255 ; 1.71,-7 1.71,-6.97 ; 1.71,-6.985 2.83,-6.985 ; 1.71,-5.73 1.71,-5.7 ; 1.71,-5.715 2.83,-5.715 ; 1.71,-4.46 1.71,-4.43 ; 1.71,-4.445 2.83,-4.445 ; 1.71,-3.19 1.71,-3.16 ; 1.71,-3.175 2.83,-3.175 ; 1.71,-1.92 1.71,-1.89 ; 1.71,-1.905 2.83,-1.905 ; 1.71,-0.65 1.71,-0.62 ; 1.71,-0.635 2.83,-0.635 ; 2.83,-34.55 6.83,-34.55 6.83,-34.03 2.83,-34.03 ; 2.83,-33.28 6.83,-33.28 6.83,-32.76 2.83,-32.76 ; 2.83,-32.01 6.83,-32.01 6.83,-31.49 2.83,-31.49 ; 2.83,-30.74 6.83,-30.74 6.83,-30.22 2.83,-30.22 ; 2.83,-29.47 6.83,-29.47 6.83,-28.95 2.83,-28.95 ; 2.83,-28.2 6.83,-28.2 6.83,-27.68 2.83,-27.68 ; 2.83,-26.93 6.83,-26.93 6.83,-26.41 2.83,-26.41 ; 2.83,-25.66 6.83,-25.66 6.83,-25.14 2.83,-25.14 ; 2.83,-24.39 6.83,-24.39 6.83,-23.87 2.83,-23.87 ; 2.83,-23.12 6.83,-23.12 6.83,-22.6 2.83,-22.6 ; 2.83,-21.85 6.83,-21.85 6.83,-21.33 2.83,-21.33 ; 2.83,-20.58 6.83,-20.58 6.83,-20.06 2.83,-20.06 ; 2.83,-19.31 6.83,-19.31 6.83,-18.79 2.83,-18.79 ; 2.83,-18.04 6.83,-18.04 6.83,-17.52 2.83,-17.52 ; 2.83,-16.77 6.83,-16.77 6.83,-16.25 2.83,-16.25 ; 2.83,-15.5 6.83,-15.5 6.83,-14.98 2.83,-14.98 ; 2.83,-14.23 6.83,-14.23 6.83,-13.71 2.83,-13.71 ; 2.83,-12.96 6.83,-12.96 6.83,-12.44 2.83,-12.44 ; 2.83,-11.69 6.83,-11.69 6.83,-11.17 2.83,-11.17 ; 2.83,-10.42 6.83,-10.42 6.83,-9.9 2.83,-9.9 ; 2.83,-9.15 6.83,-9.15 6.83,-8.63 2.83,-8.63 ; 2.83,-7.88 6.83,-7.88 6.83,-7.36 2.83,-7.36 ; 2.83,-6.61 6.83,-6.61 6.83,-6.09 2.83,-6.09 ; 2.83,-5.34 6.83,-5.34 6.83,-4.82 2.83,-4.82 ; 2.83,-4.07 6.83,-4.07 6.83,-3.55 2.83,-3.55 ; 2.83,-2.8 6.83,-2.8 6.83,-2.28 2.83,-2.28 ; 2.83,-1.53 6.83,-1.53 6.83,-1.01 2.83,-1.01 ; 2.83,-0.26 6.83,-0.26 6.83,0.26 2.83,0.26 ; 2.83,-0.16 6.83,-0.16 ; 2.83,-0.04 6.83,-0.04 ; 2.83,0.08 6.83,0.08 ; 2.83,0.2 6.83,0.2
F.CrtYd:
  lines w0.05: -1.15,-35.45 -1.15,1.15 7.3,1.15 7.3,-35.45 -1.15,-35.45
F.Fab:
  drawing of 173 lines, arcs and shapes, not listed
  text "'.Designator'" at 2.774,-19.573 h0.6